# Altium footprint library standard-graphic-logo.PcbLib: 61 footprints (part 3 of 4)
Each footprint in its own frame and in the unit in brackets; x right, y up, seen from the top. Pads: shape width x height; smd on the part's side, far side on the other; paste and mask are expansions set on the pad; w line width, h text height; cw(c..) or ccw(c..) is an arc to the next point about the centre after c.
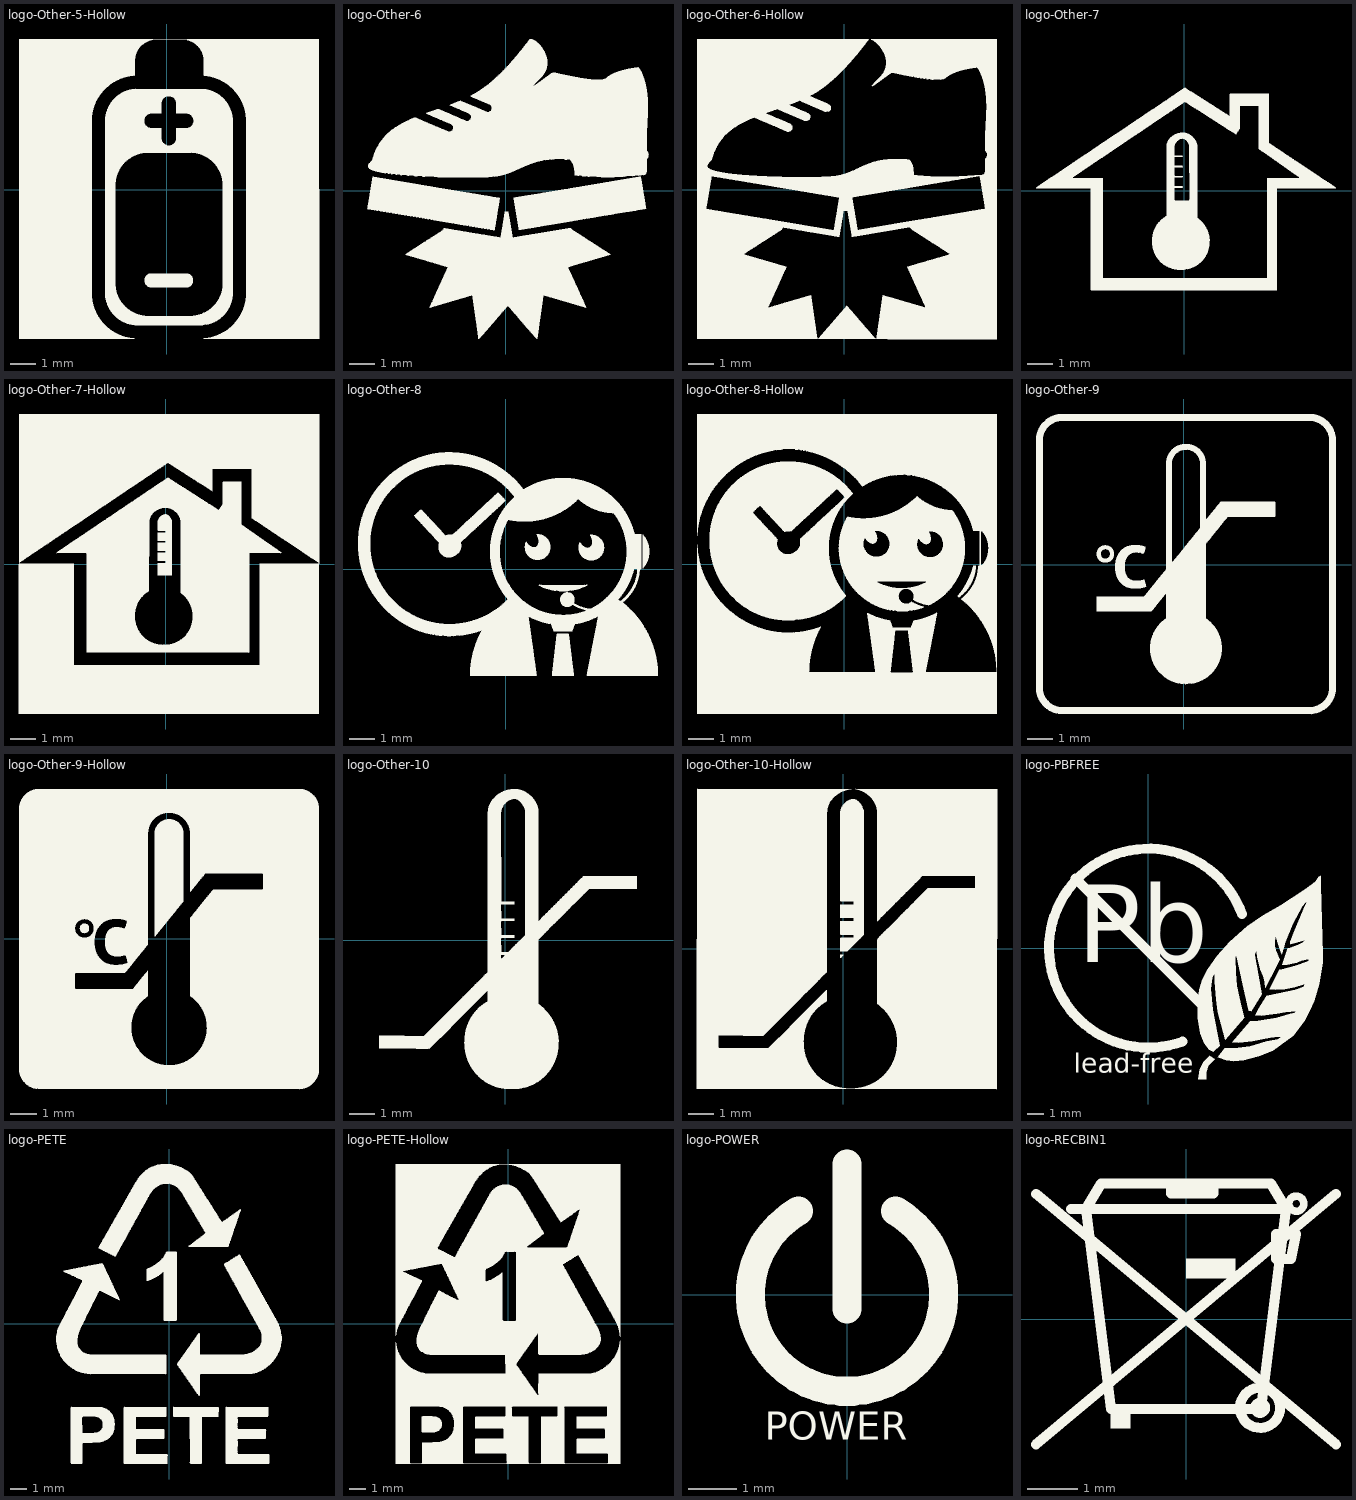
[diagram p2: the footprints below, top view; thin cyan lines are the x and y axes]

## logo-Other-5-Hollow [mm]
Top Overlay:
  drawing of 3 lines, arcs and shapes, not listed
  text "TarahiBoard.com" at -5.314,-0.869 h0.1

## logo-Other-6 [mm]
Top Overlay:
  drawing of 4 lines, arcs and shapes, not listed
  text "TarahiBoard.com" at 1.29,2.941 h0.1

## logo-Other-6-Hollow [mm]
Top Overlay:
  drawing of 1 lines, arcs and shapes, not listed
  text "TarahiBoard.com" at 3.449,-4.171 h0.1

## logo-Other-7 [mm]
Top Overlay:
  drawing of 2 lines, arcs and shapes, not listed
  text "TarahiBoard.com" at 0.274,-3.79 h0.1

## logo-Other-7-Hollow [mm]
Top Overlay:
  drawing of 3 lines, arcs and shapes, not listed
  text "TarahiBoard.com" at -1.377,-4.679 h0.1

## logo-Other-8 [mm]
Top Overlay:
  drawing of 7 lines, arcs and shapes, not listed
  text "TarahiBoard.com" at -0.869,-2.266 h0.1

## logo-Other-8-Hollow [mm]
Top Overlay:
  drawing of 4 lines, arcs and shapes, not listed
  text "TarahiBoard.com" at -4.933,-5.187 h0.1

## logo-Other-9 [mm]
Top Overlay:
  drawing of 4 lines, arcs and shapes, not listed
  text "TarahiBoard.com" at -0.615,-3.409 h0.1

## logo-Other-9-Hollow [mm]
Top Overlay:
  drawing of 3 lines, arcs and shapes, not listed
  text "TarahiBoard.com" at 2.687,0.274 h0.1

## logo-Other-10 [mm]
Top Overlay:
  drawing of 1 lines, arcs and shapes, not listed
  text "TarahiBoard.com" at -0.615,-4.044 h0.1

## logo-Other-10-Hollow [mm]
Top Overlay:
  drawing of 3 lines, arcs and shapes, not listed
  text "TarahiBoard.com" at 3.068,-0.869 h0.1

## logo-PBFREE [mm]
Top Overlay:
  drawing of 4 lines, arcs and shapes, not listed
  text "TarahiBoard.com" at 0.742,0.909 h0.1
  text "lead-free" at -4.5,-7.9 h2
  text "Pb" at -4.3,-2.4 h8

## logo-PETE [mm]
Top Overlay:
  drawing of 8 lines, arcs and shapes, not listed

## logo-PETE-Hollow [mm]
Top Overlay:
  drawing of 2 lines, arcs and shapes, not listed

## logo-POWER [mm]
Top Overlay:
  lines w0.6: -1,1.732 ccw(c0,0) 1,1.732 ; 0,-0.3 0,2.7
  text "POWER" at -1.7,-3.2 h1
  text "TarahiBoard.com" at 0.107,-0.107 h0.1

## logo-RECBIN1 [mm]
Top Overlay:
  circle w0.15: c2.2,2.3 r0.15
  circle w0.2: c1.477,-1.771 r0.4
  circle w0.2: c1.477,-1.771 r0.1
  region: -1.496,-1.798 -1.113,-1.798 -1.113,-2.181 -1.496,-2.181
  region: 0,1.2 0.98,1.2 0.98,0.817 0,0.817
  lines w0.2: -2.991,-2.498 2.991,2.498 ; -2.991,2.498 2.991,-2.498 ; -2.293,2.199 1.994,2.199 ; -0.3,2.617 -0.3,2.5 0.544,2.5 0.544,2.656 ; 1.994,2.199 1.695,2.698 -1.695,2.698 -1.994,2.199 -1.496,-1.798 1.496,-1.798 1.994,2.199 ; 1.795,1.2 2.094,1.2 2.193,1.699 1.795,1.699 1.795,1.2
  text "TarahiBoard.com" at -0.582,2.132 h0.1